# Altium footprint library Hydra_Ref_pcb.PcbLib: 353 footprints (part 5 of 23)
Each footprint in its own frame and in the unit in brackets; x right, y up, seen from the top. Pads: shape width x height; smd on the part's side, far side on the other; paste and mask are expansions set on the pad; w line width, h text height; cw(c..) or ccw(c..) is an arc to the next point about the centre after c.
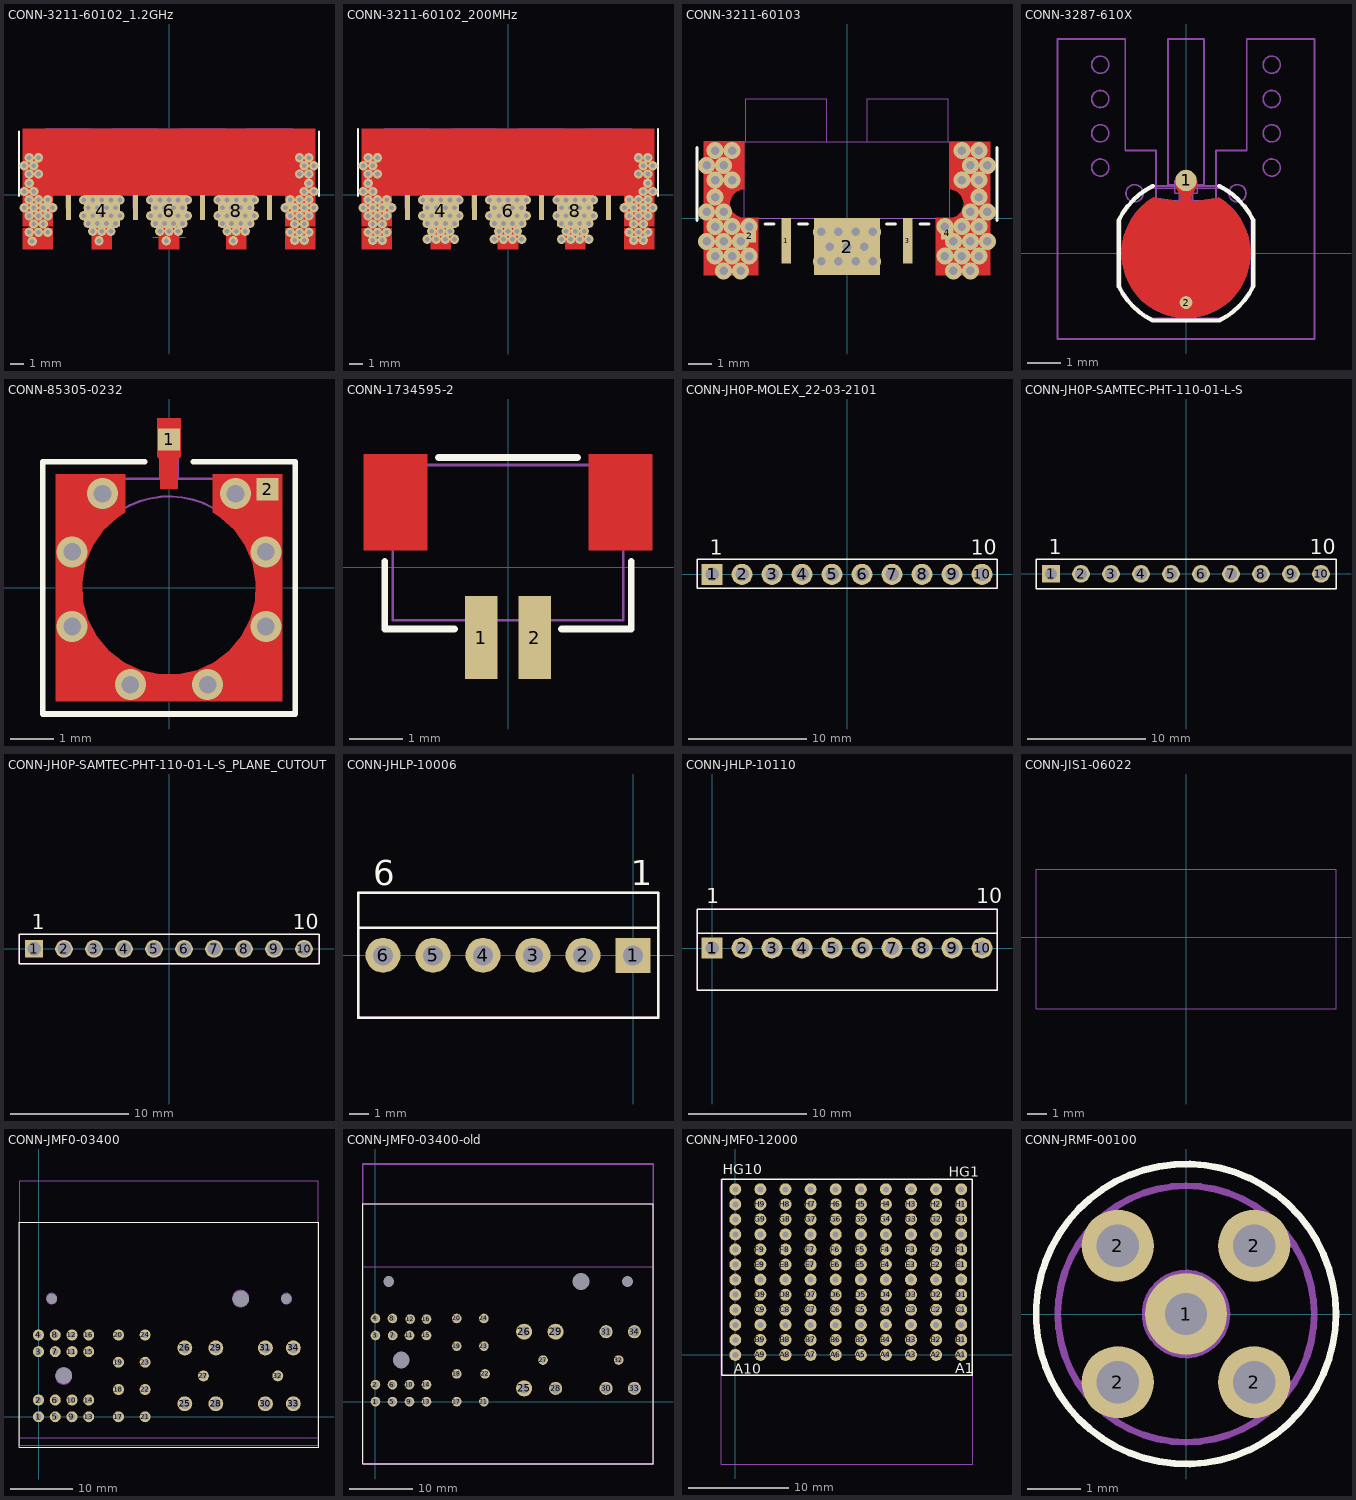
[diagram p4: the footprints below, top view; thin cyan lines are the x and y axes]

## CONN-3211-60102_1.2GHz [mil] "SMPM SB MALE 4 PORT EDGE MOUNT - SV Microwave, Inc"
height 85
pads (9):
  rect 14.96x75 smd: 1(-300,-37.5) 3(-100,-37.5) 5(100,-37.5) 7(300,-37.5)
  rect 20x20 smd paste-1000 mask-1000: 2(-360,-30) 8(359.05,-25.01)
  rect 108x94 smd: 4(-200,-47) 6(0,-47) 8(200,-47)
via -408,-138.07 diameter 28 hole 14
via -361,-14 diameter 28 hole 14
via -389,-14 diameter 28 hole 14
via -375,-38.25 diameter 28 hole 14
via -361,-62.5 diameter 28 hole 14
via -389,-62.5 diameter 28 hole 14
via -403,-38.25 diameter 28 hole 14
via -403,10.25 diameter 28 hole 14
via -417,-14 diameter 28 hole 14
via -417,-62.5 diameter 28 hole 14
via -417,34.5 diameter 28 hole 14
via -403,-86.75 diameter 28 hole 14
via -375,-86.75 diameter 28 hole 14
via -417,62.5 diameter 28 hole 14
via -389,62.5 diameter 28 hole 14
via -403,86.75 diameter 28 hole 14
via -417,110.99 diameter 28 hole 14
via -389,110.99 diameter 28 hole 14
via -431,10.25 diameter 28 hole 14
via -431,86.75 diameter 28 hole 14
via -431,-38.25 diameter 28 hole 14
via 431,-38.25 diameter 28 hole 14
via 431,86.75 diameter 28 hole 14
via 431,10.25 diameter 28 hole 14
via 389,110.99 diameter 28 hole 14
via 417,110.99 diameter 28 hole 14
via 403,86.75 diameter 28 hole 14
via 389,62.5 diameter 28 hole 14
via 417,62.5 diameter 28 hole 14
via 375,-86.75 diameter 28 hole 14
via 403,-86.75 diameter 28 hole 14
via 417,34.5 diameter 28 hole 14
via 417,-62.5 diameter 28 hole 14
via 417,-14 diameter 28 hole 14
via 403,10.25 diameter 28 hole 14
via 403,-38.25 diameter 28 hole 14
via 389,-62.5 diameter 28 hole 14
via 361,-62.5 diameter 28 hole 14
via 375,-38.25 diameter 28 hole 14
via 389,-14 diameter 28 hole 14
via 361,-14 diameter 28 hole 14
via 0,-15 diameter 28 hole 14
via 27,-15 diameter 28 hole 14
via 13.5,-38.38 diameter 28 hole 14
via 40.5,-38.38 diameter 28 hole 14
via 54,-15 diameter 28 hole 14
via -13.5,-38.38 diameter 28 hole 14
via -27,-61.77 diameter 28 hole 14
via -27,-15 diameter 28 hole 14
via -40.5,-38.38 diameter 28 hole 14
via -54,-15 diameter 28 hole 14
via -54,-61.77 diameter 28 hole 14
via 0,-61.77 diameter 28 hole 14
via 27,-61.77 diameter 28 hole 14
via 54,-61.77 diameter 28 hole 14
via -40.5,-85.15 diameter 28 hole 14
via -13.5,-85.15 diameter 28 hole 14
via 40.5,-85.15 diameter 28 hole 14
via 13.5,-85.15 diameter 28 hole 14
via -27,-108.53 diameter 28 hole 14
via 27,-108.53 diameter 28 hole 14
via 0,-108.53 diameter 28 hole 14
via -200,-108.53 diameter 28 hole 14
via -173,-108.53 diameter 28 hole 14
via -227,-108.53 diameter 28 hole 14
via -186.5,-85.15 diameter 28 hole 14
via -159.5,-85.15 diameter 28 hole 14
via -213.5,-85.15 diameter 28 hole 14
via -240.5,-85.15 diameter 28 hole 14
via -146,-61.77 diameter 28 hole 14
via -173,-61.77 diameter 28 hole 14
via -200,-61.77 diameter 28 hole 14
via -254,-61.77 diameter 28 hole 14
via -254,-15 diameter 28 hole 14
via -240.5,-38.38 diameter 28 hole 14
via -227,-15 diameter 28 hole 14
via -227,-61.77 diameter 28 hole 14
via -213.5,-38.38 diameter 28 hole 14
via -146,-15 diameter 28 hole 14
via -159.5,-38.38 diameter 28 hole 14
via -186.5,-38.38 diameter 28 hole 14
via -173,-15 diameter 28 hole 14
via -200,-15 diameter 28 hole 14
via 200,-108.53 diameter 28 hole 14
via 227,-108.53 diameter 28 hole 14
via 173,-108.53 diameter 28 hole 14
via 213.5,-85.15 diameter 28 hole 14
via 240.5,-85.15 diameter 28 hole 14
via 186.5,-85.15 diameter 28 hole 14
via 159.5,-85.15 diameter 28 hole 14
via 254,-61.77 diameter 28 hole 14
via 227,-61.77 diameter 28 hole 14
via 200,-61.77 diameter 28 hole 14
via 146,-61.77 diameter 28 hole 14
via 146,-15 diameter 28 hole 14
via 159.5,-38.38 diameter 28 hole 14
via 173,-15 diameter 28 hole 14
via 173,-61.77 diameter 28 hole 14
via 186.5,-38.38 diameter 28 hole 14
via 254,-15 diameter 28 hole 14
via 240.5,-38.38 diameter 28 hole 14
via 213.5,-38.38 diameter 28 hole 14
via 227,-15 diameter 28 hole 14
via 200,-15 diameter 28 hole 14
via -347,-38.25 diameter 28 hole 14
via 347,-38.25 diameter 28 hole 14
via -389,-110.99 diameter 28 hole 14
via -417,-110.99 diameter 28 hole 14
via -361,-110.99 diameter 28 hole 14
via 375,-135.24 diameter 28 hole 14
via 403,-135.24 diameter 28 hole 14
via 417,-110.99 diameter 28 hole 14
via 361,-110.99 diameter 28 hole 14
via 389,-110.99 diameter 28 hole 14
via -208.5,-137.07 diameter 28 hole 14
via -8.5,-137.07 diameter 28 hole 14
via 191.5,-137.07 diameter 28 hole 14
Top Layer:
  pour cut-out: 436,-161.6 436,-100 346,-100 346,-161.6
  pour cut-out: -436,-161.6 -436,-100 -346,-100 -346,-161.6
  pour cut-out: -230,-100 -230,-161.6 -170,-161.6 -170,-100
  pour cut-out: -30,-100 -30,-161.6 30,-161.6 30,-100
  pour cut-out: 170,-100 170,-161.6 230,-161.6 230,-100
  region: -436,-93.99 -436,197 -369.5,197 -369.5,31 -372.52,30.7 -378.11,28.39 -382.39,24.11 -384.7,18.52 -384.7,12.48 -382.39,6.89 -378.11,2.61 -372.52,0.3 -369.5,0 -346,0 -346,-93.99
  region: 346,-93.99 346,0 369.5,0 372.52,0.3 378.11,2.61 382.39,6.89 384.7,12.48 384.7,18.52 382.39,24.11 378.11,28.39 372.52,30.7 369.5,31 369.5,197 436,197 436,-93.99
  pour cut-out: -369.5,0 -372.58,0 -378.28,2.36 -382.64,6.72 -385,12.42 -385,18.58 -382.64,24.28 -378.28,28.64 -372.58,31 -369.5,31 -369.5,197 369.5,197 369.5,31 372.58,31 378.28,28.64 382.64,24.28 385,18.58 385,12.42 382.64,6.72 378.28,2.36 372.58,0 369.5,0
Mid-Layer 1:
  pour cut-out: -369.5,0 -372.58,0 -378.28,2.36 -382.64,6.72 -385,12.42 -385,18.58 -382.64,24.28 -378.28,28.64 -372.58,31 -369.5,31 -369.5,197 369.5,197 369.5,31 372.58,31 378.28,28.64 382.64,24.28 385,18.58 385,12.42 382.64,6.72 378.28,2.36 372.58,0 369.5,0
MidLayer3:
  pour cut-out: -369.5,0 -372.58,0 -378.28,2.36 -382.64,6.72 -385,12.42 -385,18.58 -382.64,24.28 -378.28,28.64 -372.58,31 -369.5,31 -369.5,197 369.5,197 369.5,31 372.58,31 378.28,28.64 382.64,24.28 385,18.58 385,12.42 382.64,6.72 378.28,2.36 372.58,0 369.5,0
MidLayer2:
  pour cut-out: -369.5,0 -372.58,0 -378.28,2.36 -382.64,6.72 -385,12.42 -385,18.58 -382.64,24.28 -378.28,28.64 -372.58,31 -369.5,31 -369.5,197 369.5,197 369.5,31 372.58,31 378.28,28.64 382.64,24.28 385,18.58 385,12.42 382.64,6.72 378.28,2.36 372.58,0 369.5,0
Bottom Layer:
  pour cut-out: -369.5,0 -372.58,0 -378.28,2.36 -382.64,6.72 -385,12.42 -385,18.58 -382.64,24.28 -378.28,28.64 -372.58,31 -369.5,31 -369.5,197 369.5,197 369.5,31 372.58,31 378.28,28.64 382.64,24.28 385,18.58 385,12.42 382.64,6.72 378.28,2.36 372.58,0 369.5,0
Top Overlay:
  lines w5: -447,-4 -447,190 ; 447,-4 447,190
Top Paste:
  region: 346,-93.99 346,0 369.5,0 372.52,0.3 378.11,2.61 382.39,6.89 384.7,12.48 384.7,18.52 382.39,24.11 378.11,28.39 372.52,30.7 369.5,31 369.5,197 436,197 436,-93.99
  region: -436,-93.99 -436,197 -369.5,197 -369.5,31 -372.52,30.7 -378.11,28.39 -382.39,24.11 -384.7,18.52 -384.7,12.48 -382.39,6.89 -378.11,2.61 -372.52,0.3 -369.5,0 -346,0 -346,-93.99
Top Solder:
  rectangle: 269,-79 331,4
  rectangle: 69,-79 131,4
  rectangle: -131,-79 -69,4
  rectangle: -331,-79 -269,4
  rectangle: 368,-2.5 401,49
  region: -441,-98.98 -441,197 -365,197 -365,4 -342,4 -342,-98.98
  region: 441,197 441,-99.51 342,-99.51 342,4 365,4 365,197
9 Top Assy:
  lines w2: -421,0 420.69,0 ; -367,0 -367,126 -367,197 -233,197 -233,126 ; -351,0 -351,-79 -421,-79 -421,126 421,126 421,-79 351,-79 351,0 ; -306,0 -306,-39 -294,-39 -294,0 ; -249,0 -249,-79 -151,-79 -151,0 ; -167,126 -167,197 -33,197 -33,126 ; -150,0 -40,0 ; -106,0 -106,-39 -94,-39 -94,0 ; -49,-125.77 49,-125.77 ; -49,0 -49,-79 49,-79 49,0 ; 33,126 33,197 167,197 167,126 ; 94,0 94,-39 106,-39 106,0 ; 151,0 151,-79 249,-79 249,0 ; 233,126 233,197 367,197 367,126 367,0 ; 294,0 294,-39 306,-39 306,0
  text ".Designator" at -60,40 h40
3D body: height 85, standoff 0, extent -450,-105 450,135

## CONN-3211-60102_200MHz [mil] "SMPM SB MALE 4 PORT EDGE MOUNT - SV Microwave, Inc"
height 85
pads (9):
  rect 14.96x75 smd: 1(-300,-37.5) 3(-100,-37.5) 5(100,-37.5) 7(300,-37.5)
  rect 20x20 smd paste-1000 mask-1000: 2(-360,-30) 8(359.05,-25.01)
  rect 108x94 smd: 4(-200,-47) 6(0,-47) 8(200,-47)
via 389,-110.99 diameter 28 hole 14
via 361,-110.99 diameter 28 hole 14
via 417,-110.99 diameter 28 hole 14
via 403,-135.24 diameter 28 hole 14
via 375,-135.24 diameter 28 hole 14
via -403,-135.24 diameter 28 hole 14
via -375,-135.24 diameter 28 hole 14
via -361,-110.99 diameter 28 hole 14
via -417,-110.99 diameter 28 hole 14
via -389,-110.99 diameter 28 hole 14
via 347,-38.25 diameter 28 hole 14
via -347,-38.25 diameter 28 hole 14
via 200,-15 diameter 28 hole 14
via 227,-15 diameter 28 hole 14
via 213.5,-38.38 diameter 28 hole 14
via 240.5,-38.38 diameter 28 hole 14
via 254,-15 diameter 28 hole 14
via 186.5,-38.38 diameter 28 hole 14
via 173,-61.77 diameter 28 hole 14
via 173,-15 diameter 28 hole 14
via 159.5,-38.38 diameter 28 hole 14
via 146,-15 diameter 28 hole 14
via 146,-61.77 diameter 28 hole 14
via 200,-61.77 diameter 28 hole 14
via 227,-61.77 diameter 28 hole 14
via 254,-61.77 diameter 28 hole 14
via 159.5,-85.15 diameter 28 hole 14
via 186.5,-85.15 diameter 28 hole 14
via 240.5,-85.15 diameter 28 hole 14
via 213.5,-85.15 diameter 28 hole 14
via 173,-108.53 diameter 28 hole 14
via 227,-108.53 diameter 28 hole 14
via 200,-108.53 diameter 28 hole 14
via 213.5,-131.91 diameter 28 hole 14
via 240.5,-131.91 diameter 28 hole 14
via 186.5,-131.91 diameter 28 hole 14
via 159.5,-131.91 diameter 28 hole 14
via -200,-15 diameter 28 hole 14
via -173,-15 diameter 28 hole 14
via -186.5,-38.38 diameter 28 hole 14
via -159.5,-38.38 diameter 28 hole 14
via -146,-15 diameter 28 hole 14
via -213.5,-38.38 diameter 28 hole 14
via -227,-61.77 diameter 28 hole 14
via -227,-15 diameter 28 hole 14
via -240.5,-38.38 diameter 28 hole 14
via -254,-15 diameter 28 hole 14
via -254,-61.77 diameter 28 hole 14
via -200,-61.77 diameter 28 hole 14
via -173,-61.77 diameter 28 hole 14
via -146,-61.77 diameter 28 hole 14
via -240.5,-85.15 diameter 28 hole 14
via -213.5,-85.15 diameter 28 hole 14
via -159.5,-85.15 diameter 28 hole 14
via -186.5,-85.15 diameter 28 hole 14
via -227,-108.53 diameter 28 hole 14
via -173,-108.53 diameter 28 hole 14
via -200,-108.53 diameter 28 hole 14
via -186.5,-131.91 diameter 28 hole 14
via -159.5,-131.91 diameter 28 hole 14
via -213.5,-131.91 diameter 28 hole 14
via -240.5,-131.91 diameter 28 hole 14
via -40.5,-131.91 diameter 28 hole 14
via -13.5,-131.91 diameter 28 hole 14
via 40.5,-131.91 diameter 28 hole 14
via 13.5,-131.91 diameter 28 hole 14
via 0,-108.53 diameter 28 hole 14
via 27,-108.53 diameter 28 hole 14
via -27,-108.53 diameter 28 hole 14
via 13.5,-85.15 diameter 28 hole 14
via 40.5,-85.15 diameter 28 hole 14
via -13.5,-85.15 diameter 28 hole 14
via -40.5,-85.15 diameter 28 hole 14
via 54,-61.77 diameter 28 hole 14
via 27,-61.77 diameter 28 hole 14
via 0,-61.77 diameter 28 hole 14
via -54,-61.77 diameter 28 hole 14
via -54,-15 diameter 28 hole 14
via -40.5,-38.38 diameter 28 hole 14
via -27,-15 diameter 28 hole 14
via -27,-61.77 diameter 28 hole 14
via -13.5,-38.38 diameter 28 hole 14
via 54,-15 diameter 28 hole 14
via 40.5,-38.38 diameter 28 hole 14
via 13.5,-38.38 diameter 28 hole 14
via 27,-15 diameter 28 hole 14
via 0,-15 diameter 28 hole 14
via 361,-14 diameter 28 hole 14
via 389,-14 diameter 28 hole 14
via 375,-38.25 diameter 28 hole 14
via 361,-62.5 diameter 28 hole 14
via 389,-62.5 diameter 28 hole 14
via 403,-38.25 diameter 28 hole 14
via 403,10.25 diameter 28 hole 14
via 417,-14 diameter 28 hole 14
via 417,-62.5 diameter 28 hole 14
via 417,34.5 diameter 28 hole 14
via 403,-86.75 diameter 28 hole 14
via 375,-86.75 diameter 28 hole 14
via 417,62.5 diameter 28 hole 14
via 389,62.5 diameter 28 hole 14
via 403,86.75 diameter 28 hole 14
via 417,110.99 diameter 28 hole 14
via 389,110.99 diameter 28 hole 14
via 431,10.25 diameter 28 hole 14
via 431,86.75 diameter 28 hole 14
via 431,-38.25 diameter 28 hole 14
via -431,-38.25 diameter 28 hole 14
via -431,86.75 diameter 28 hole 14
via -431,10.25 diameter 28 hole 14
via -389,110.99 diameter 28 hole 14
via -417,110.99 diameter 28 hole 14
via -403,86.75 diameter 28 hole 14
via -389,62.5 diameter 28 hole 14
via -417,62.5 diameter 28 hole 14
via -375,-86.75 diameter 28 hole 14
via -403,-86.75 diameter 28 hole 14
via -417,34.5 diameter 28 hole 14
via -417,-62.5 diameter 28 hole 14
via -417,-14 diameter 28 hole 14
via -403,10.25 diameter 28 hole 14
via -403,-38.25 diameter 28 hole 14
via -389,-62.5 diameter 28 hole 14
via -361,-62.5 diameter 28 hole 14
via -375,-38.25 diameter 28 hole 14
via -389,-14 diameter 28 hole 14
via -361,-14 diameter 28 hole 14
Top Layer:
  region: -436,-93.99 -436,197 -369.5,197 -369.5,31 -372.52,30.7 -378.11,28.39 -382.39,24.11 -384.7,18.52 -384.7,12.48 -382.39,6.89 -378.11,2.61 -372.52,0.3 -369.5,0 -346,0 -346,-93.99
  region: 346,-93.99 346,0 369.5,0 372.52,0.3 378.11,2.61 382.39,6.89 384.7,12.48 384.7,18.52 382.39,24.11 378.11,28.39 372.52,30.7 369.5,31 369.5,197 436,197 436,-93.99
  pour cut-out: 170,-100 170,-161.6 230,-161.6 230,-100
  pour cut-out: -30,-100 -30,-161.6 30,-161.6 30,-100
  pour cut-out: -230,-100 -230,-161.6 -170,-161.6 -170,-100
  pour cut-out: -436,-161.6 -436,-100 -346,-100 -346,-161.6
  pour cut-out: 436,-161.6 436,-100 346,-100 346,-161.6
  pour cut-out: -369.5,0 -372.58,0 -378.28,2.36 -382.64,6.72 -385,12.42 -385,18.58 -382.64,24.28 -378.28,28.64 -372.58,31 -369.5,31 -369.5,197 369.5,197 369.5,31 372.58,31 378.28,28.64 382.64,24.28 385,18.58 385,12.42 382.64,6.72 378.28,2.36 372.58,0 369.5,0
Mid-Layer 1:
  pour cut-out: -369.5,0 -372.58,0 -378.28,2.36 -382.64,6.72 -385,12.42 -385,18.58 -382.64,24.28 -378.28,28.64 -372.58,31 -369.5,31 -369.5,197 369.5,197 369.5,31 372.58,31 378.28,28.64 382.64,24.28 385,18.58 385,12.42 382.64,6.72 378.28,2.36 372.58,0 369.5,0
MidLayer3:
  pour cut-out: -369.5,0 -372.58,0 -378.28,2.36 -382.64,6.72 -385,12.42 -385,18.58 -382.64,24.28 -378.28,28.64 -372.58,31 -369.5,31 -369.5,197 369.5,197 369.5,31 372.58,31 378.28,28.64 382.64,24.28 385,18.58 385,12.42 382.64,6.72 378.28,2.36 372.58,0 369.5,0
MidLayer2:
  pour cut-out: -369.5,0 -372.58,0 -378.28,2.36 -382.64,6.72 -385,12.42 -385,18.58 -382.64,24.28 -378.28,28.64 -372.58,31 -369.5,31 -369.5,197 369.5,197 369.5,31 372.58,31 378.28,28.64 382.64,24.28 385,18.58 385,12.42 382.64,6.72 378.28,2.36 372.58,0 369.5,0
Bottom Layer:
  pour cut-out: -369.5,0 -372.58,0 -378.28,2.36 -382.64,6.72 -385,12.42 -385,18.58 -382.64,24.28 -378.28,28.64 -372.58,31 -369.5,31 -369.5,197 369.5,197 369.5,31 372.58,31 378.28,28.64 382.64,24.28 385,18.58 385,12.42 382.64,6.72 378.28,2.36 372.58,0 369.5,0
Top Overlay:
  lines w5: -447,-4 -447,197 ; 447,-4 447,197
Top Paste:
  region: -436,-93.99 -436,197 -369.5,197 -369.5,31 -372.52,30.7 -378.11,28.39 -382.39,24.11 -384.7,18.52 -384.7,12.48 -382.39,6.89 -378.11,2.61 -372.52,0.3 -369.5,0 -346,0 -346,-93.99
  region: 346,-93.99 346,0 369.5,0 372.52,0.3 378.11,2.61 382.39,6.89 384.7,12.48 384.7,18.52 382.39,24.11 378.11,28.39 372.52,30.7 369.5,31 369.5,197 436,197 436,-93.99
Top Solder:
  rectangle: 368,-2.5 401,49
  rectangle: -331,-79 -269,4
  rectangle: -131,-79 -69,4
  rectangle: 69,-79 131,4
  rectangle: 269,-79 331,4
  region: 441,197 441,-99.51 342,-99.51 342,4 365,4 365,197
  region: -441,-98.98 -441,197 -365,197 -365,4 -342,4 -342,-98.98
9 Top Assy:
  lines w2: -421,0 420.69,0 ; -367,0 -367,126 -367,197 -233,197 -233,126 ; -351,0 -351,-79 -421,-79 -421,126 421,126 421,-79 351,-79 351,0 ; -306,0 -306,-39 -294,-39 -294,0 ; -249,0 -249,-79 -151,-79 -151,0 ; -167,126 -167,197 -33,197 -33,126 ; -150,0 -40,0 ; -106,0 -106,-39 -94,-39 -94,0 ; -49,-125.77 49,-125.77 ; -49,0 -49,-79 49,-79 49,0 ; 33,126 33,197 167,197 167,126 ; 94,0 94,-39 106,-39 106,0 ; 151,0 151,-79 249,-79 249,0 ; 233,126 233,197 367,197 367,126 367,0 ; 294,0 294,-39 306,-39 306,0
  text ".Designator" at -60,40 h40
3D body: height 85, standoff 0, extent -450,-105 450,135

## CONN-3211-60103 [mil] "SMPM SB MALE 2 PORT EDGE MOUNT - SV Microwave, Inc"
height 77
pads (5):
  rect 14.96x75 smd: 1(-100,-37.5) 3(100,-37.5)
  rect 20x20 smd paste-1000 mask-1000: 2(-160,-30) 4(165,-25)
  rect 108x94 smd: 2(0,-47)
via 231,-38.25 diameter 28 hole 14
via 231,86.75 diameter 28 hole 14
via 231,10.25 diameter 28 hole 14
via 189,110.99 diameter 28 hole 14
via 217,110.99 diameter 28 hole 14
via 203,86.75 diameter 28 hole 14
via 189,62.5 diameter 28 hole 14
via 217,62.5 diameter 28 hole 14
via 175,-86.75 diameter 28 hole 14
via 203,-86.75 diameter 28 hole 14
via 217,34.5 diameter 28 hole 14
via 217,-62.5 diameter 28 hole 14
via 217,-14 diameter 28 hole 14
via 203,10.25 diameter 28 hole 14
via 203,-38.25 diameter 28 hole 14
via 189,-62.5 diameter 28 hole 14
via 161,-62.5 diameter 28 hole 14
via 175,-38.25 diameter 28 hole 14
via 189,-14 diameter 28 hole 14
via 161,-14 diameter 28 hole 14
via -161,-14 diameter 28 hole 14
via -189,-14 diameter 28 hole 14
via -175,-38.25 diameter 28 hole 14
via -161,-62.5 diameter 28 hole 14
via -189,-62.5 diameter 28 hole 14
via -203,-38.25 diameter 28 hole 14
via -203,10.25 diameter 28 hole 14
via -217,-14 diameter 28 hole 14
via -217,-62.5 diameter 28 hole 14
via -217,34.5 diameter 28 hole 14
via -203,-86.75 diameter 28 hole 14
via -175,-86.75 diameter 28 hole 14
via -217,62.5 diameter 28 hole 14
via -189,62.5 diameter 28 hole 14
via -203,86.75 diameter 28 hole 14
via -217,110.99 diameter 28 hole 14
via -189,110.99 diameter 28 hole 14
via -231,10.25 diameter 28 hole 14
via -231,86.75 diameter 28 hole 14
via -231,-38.25 diameter 28 hole 14
via 14,-71.25 diameter 28 hole 14
via -14,-71.25 diameter 28 hole 14
via -28,-47 diameter 28 hole 14
via -14,-22.75 diameter 28 hole 14
via 0,-47 diameter 28 hole 14
via 28,-47 diameter 28 hole 14
via 14,-22.75 diameter 28 hole 14
via -42,-71.25 diameter 28 hole 14
via 42,-71.25 diameter 28 hole 14
via -42,-22.75 diameter 28 hole 14
via 42,-22.75 diameter 28 hole 14
Top Layer:
  region: -169.5,126.46 -169.5,47.46 -174.08,47.01 -182.56,43.5 -189.04,37.02 -192.55,28.55 -193,23.96 -192.55,19.38 -189.04,10.9 -182.56,4.42 -174.08,0.91 -169.5,0.46 -146,0.46 -146,-94 -236,-94 -236,126.46
  region: 168.5,126 168.5,47.27 173.08,46.82 181.55,43.31 188.04,36.83 191.55,28.36 192,23.77 191.55,19.19 188.04,10.71 181.56,4.23 173.08,0.72 168.5,0.27 146,0.27 146,-94 236,-94 236,126
Top Overlay:
  lines w5: -247,-4 -247,116 ; -135,-10 -120,-10 ; -80,-10 -65,-10 ; 65,-10 80,-10 ; 120,-10 135,-10 ; 247,-4 247,116
Top Paste:
  region: -169.5,126.46 -169.5,47.46 -174.08,47.01 -182.56,43.5 -189.04,37.02 -192.55,28.55 -193,23.96 -192.55,19.38 -189.04,10.9 -182.56,4.42 -174.08,0.91 -169.5,0.46 -146,0.46 -146,-94 -236,-94 -236,126.46
  region: 169,126 169,47.27 173.58,46.82 182.05,43.31 188.54,36.83 192.05,28.36 192.5,23.77 192.05,19.19 188.54,10.71 182.05,4.23 173.58,0.72 169,0.27 146,0.27 146,-94 236,-94 236,126
Top Solder:
  rectangle: -196.5,-3 -164.5,48
  rectangle: 164,-2.5 197,49
  region: 164,131 164,47.27 169,47.27 173.58,46.82 182.05,43.31 188.54,36.83 192.05,28.36 192.5,23.77 192.05,19.19 188.54,10.71 182.05,4.23 173.58,0.72 169,0.27 169,5.5 142,5.5 142,-99 241,-99 241,131
  region: -164.5,131.5 -164.5,47.46 -169.5,47.46 -174.08,47.01 -182.56,43.5 -189.04,37.02 -192.55,28.55 -193,23.96 -192.55,19.38 -189.04,10.9 -182.56,4.42 -174.08,0.91 -169.5,0.46 -169.5,4.5 -142,4.5 -142,-99 -240.5,-99 -240.5,131.5
9 Top Assy:
  lines w2: -221,0 221,0 ; -169,0 -169,126 ; -167,126 -167,197 -33,197 -33,126 ; -151,0 -151,-79 -221,-79 -221,126 221,126 221,-79 151,-79 151,0 ; -150,0 -40,0 ; -106,0 -106,-39 -94,-39 -94,0 ; -49,0 -49,-79 49,-79 49,0 ; 33,126 33,197 167,197 167,126 ; 94,0 94,-39 106,-39 106,0 ; 169,0 169,126
  text ".Designator" at -60,40 h40
3D body: height 77, standoff 0, extent -250,-105.21 250,134.79

## CONN-3287-610X [mil] "SMMP;M;PCB;.152X.152X.150;SURF MT"
height 155
pads (2):
  round 25 smd paste+0 mask+2.5: 1(0,85)
  round 15 smd paste-1000 mask-1000: 2(0,-57.5)
Top Layer:
  pour cut-out: -14.06,33.14 -18.62,31.21 -26.36,25.02 -32.13,16.98 -35.52,7.67 -36.28,-2.21 -34.33,-11.92 -29.84,-20.75 -23.13,-28.03 -14.7,-33.24 -5.18,-35.97 4.72,-36.03 14.28,-33.42 22.77,-28.32 29.57,-21.12 34.18,-12.36 36.24,-2.67 35.62,7.22 32.35,16.57 26.67,24.68 19.02,30.97 14.48,32.96 14.48,61 -14.06,61
  region: -38,64.66 -45.06,60.51 -57.06,49.36 -66.37,35.88 -72.55,20.71 -75.31,4.57 -74.52,-11.79 -70.22,-27.6 -62.61,-42.1 -52.05,-54.62 -39.03,-64.56 -24.18,-71.47 -8.19,-75 8.19,-75 24.18,-71.47 39.03,-64.56 52.05,-54.62 62.61,-42.1 70.22,-27.6 74.52,-11.79 75.31,4.57 72.55,20.71 66.37,35.88 57.06,49.36 45.06,60.51 38,64.66 13.5,61 13.54,61 13.54,30.09 18.44,27.37 26.51,19.66 31.54,9.7 32.97,-1.37 30.63,-12.28 24.78,-21.79 16.1,-28.8 5.58,-32.52 -5.58,-32.52 -16.1,-28.8 -24.78,-21.79 -30.63,-12.28 -32.97,-1.37 -31.54,9.7 -26.51,19.66 -18.44,27.37 -13.54,30.09 -13.5,30.09 -13.5,61
  region: -6,66 -12.5,79 -12.5,86 0,77.5 12.5,86 12.5,79 6,66 6,45 -6,45
Top Overlay:
  lines w5: -78.5,-38.72 -78.5,38.59 cw(c0,0) -38.59,78.49 ; -78.49,-38.59 ccw(c0,0) -38.59,-78.49 38.72,-78.5 ; 38.59,-78.49 ccw(c0,0) 78.49,-38.59 78.5,38.72 ; 38.59,78.49 cw(c0,0) 78.49,38.59
Top Solder:
  circle w30: c0,0 r15
  rectangle: -8.5,21 8.5,35
  region: -18.5,57 -18.5,61.5 -23.5,62.5 -38.04,64.71 -41.87,62.66 -47.58,57.98 -53.29,53.29 -57.98,47.58 -62.66,41.87 -66.14,35.35 -69.63,28.84 -73.91,14.7 -74.64,7.35 -75.36,0 -74.64,-7.35 -73.91,-14.7 -72,-21 -69.63,-28.84 -66.14,-35.35 -62.66,-41.87 -57.98,-47.58 -53.29,-53.29 -47,-58.5 -41.87,-62.66 -35.35,-66.14 -28.84,-69.63 -14.7,-73.92 -7.35,-74.64 0,-75.36 7.35,-74.64 14.7,-73.92 28.84,-69.63 35.35,-66.14 41.87,-62.66 47.58,-57.98 53.29,-53.29 57.98,-47.58 62.66,-41.87 65,-37.5 69.63,-28.84 73.91,-14.7 74.64,-7.35 75.36,0 74.64,7.35 73.91,14.7 69.63,28.84 66.14,35.35 62.66,41.87 57.98,47.58 53.29,53.29 47.58,57.98 41.87,62.66 38.04,64.71 18.5,62 18.5,57 27,51.5 27,38 37.5,28 47,8 46.5,-6.5 41.5,-21.77 32.5,-34.5 19,-43.5 2.5,-47.5 -14,-46 -28.5,-38.5 -40.5,-25 -47.5,-8 -47.58,10.5 -41,25.5 -31.5,37.5 -27.5,39.5 -27.5,51
9 Top Assy:
  lines w2: -78.5,-38.72 -78.5,38.59 cw(c0,0) -38.59,78.49 ; -78.49,-38.59 ccw(c0,0) -38.59,-78.49 38.72,-78.5 ; -38.72,78.5 38.59,78.5 cw(c0,0) 78.49,38.59 ; 38.59,-78.49 ccw(c0,0) 78.49,-38.59 78.5,38.72 ; -6,78.5 6,78.5 6,85 -6,85 -6,78.5
  text ".Designator" at -40,-8.12 h20
13 Top 3D Bodies:
  circle w2: c0,0 r62.5
  lines w2: -6,76 -6,85 6,85 6,76 ; -75.99,-43.37 ccw(c0,0) -43.32,-76.02 43.34,-76 ccw(c0,0) 76.02,-43.32 76,43.34 ccw(c0,0) 43.32,76.02 -43.34,76 ccw(c0,0) -76.02,43.32 -76,-43.34
Mechanical 30:
  circle w2: c-31.82,-31.82 r10
  circle w2: c31.82,31.82 r10
  circle w2: c-60,70 r10
  circle w2: c-31.82,31.82 r10
  circle w2: c31.82,-31.82 r10
  circle w2: c60,70 r10
  circle w2: c-45,0 r10
  circle w2: c45,0 r10
  circle w2: c0,-45 r10
  circle w2: c-100,220 r10
  circle w2: c-100,180 r10
  circle w2: c-100,140 r10
  circle w2: c100,100 r10
  circle w2: c100,140 r10
  circle w2: c100,180 r10
  circle w2: c100,220 r10
  circle w2: c-100,100 r10
  lines w0: -13.54,30.09 ccw(c0,0) 13.54,30.09 13.54,61 ; -13.5,30.09 -13.5,61 ; -13.5,61 -38,64.66 ccw(c0,0) 38,64.66 13.5,61 13.5,0 cw(c0,0) -13.5,0 -13.5,61 ; -13,80 -13,85 0,72 13,85 13,80 6,66 6,45 -6,45 -6,66 -13,80
  lines w2: -38,64.66 -13.5,61 ; 0,-17.55 0,0 ; -13.5,61 -13.5,0 ccw(c0,0) 13.5,0 13.5,61 35,61 35,120 71,120 71,250 150,250 150,-100 -150,-100 -150,250 -71,250 -71,120 -35,120 -35,61 -13.5,61 ; -21,80 -21,250 21,250 21,80 13,80 13,70 8,70 8,45 -8,45 -8,70 -13,70 -13,80 -21,80
3D body: height 150.62, standoff 0.57, extent -76.04,-75.99 76.01,85.01

## CONN-85305-0232 [mil] "SMP PLUG SMT MOLEX"
height 165
pads (2):
  rect 20x20 smd paste-20 mask-20: 1(0,134)
  rect 20x20 smd paste-1000 mask-1000: 2(89,89)
via -60,85 diameter 28 hole 16
via 60,85 diameter 28 hole 16
via 35,-87.5 diameter 28 hole 16
via -35,-87.5 diameter 28 hole 16
via -87.5,32.5 diameter 28 hole 16
via 87.5,32.5 diameter 28 hole 16
via -87.5,-35 diameter 28 hole 16
via 87.5,-35 diameter 28 hole 16
Top Layer:
  region: 10.75,153 10.75,118.28 7.87,115.41 7.87,89.49 -7.87,89.49 -7.87,115.41 -10.75,118.28 -10.75,153
  region: 102.36,102.36 102.36,-102.36 -102.36,-102.36 -102.36,102.36 -39.37,102.36 -39.37,68.19 -46.56,63.5 -59.2,51.92 -69.03,37.87 -75.59,22.03 -78.57,5.15 -77.82,-11.98 -73.39,-28.54 -65.47,-43.75 -54.45,-56.88 -40.85,-67.32 -25.31,-74.56 -8.57,-78.27 8.57,-78.27 25.31,-74.56 40.85,-67.32 54.45,-56.88 65.47,-43.75 73.39,-28.54 77.82,-11.98 78.57,5.15 75.59,22.03 69.03,37.87 59.2,51.92 46.56,63.5 39.37,68.19 39.37,102.36
Top Overlay:
  lines w5: -22,114 -114,114 -114,-114 114,-114 114,114 22,114
Top Paste:
  region: 10.75,153 10.75,118.28 7.87,115.41 7.87,89.49 -7.87,89.49 -7.87,115.41 -10.75,118.28 -10.75,153
  region: 102.36,102.36 102.36,-102.36 -102.36,-102.36 -102.36,102.36 -39.37,102.36 -39.37,68.19 -46.56,63.5 -59.2,51.92 -69.03,37.87 -75.59,22.03 -78.57,5.15 -77.82,-11.98 -73.39,-28.54 -65.47,-43.75 -54.45,-56.88 -40.85,-67.32 -25.31,-74.56 -8.57,-78.27 8.57,-78.27 25.31,-74.56 40.85,-67.32 54.45,-56.88 65.47,-43.75 73.39,-28.54 77.82,-11.98 78.57,5.15 75.59,22.03 69.03,37.87 59.2,51.92 46.56,63.5 39.37,68.19 39.37,102.36
Top Solder:
  region: 106.5,106.5 106.5,-106.5 -106.5,-106.5 -106.5,106.5 -34.37,106.5 -34.37,66.1 -41.37,61.91 -53.76,51.33 -63.53,38.3 -70.2,23.43 -73.44,7.46 -73.1,-8.82 -69.19,-24.64 -61.9,-39.21 -51.59,-51.83 -38.76,-61.87 -24.04,-68.85 -8.15,-72.43 8.15,-72.43 24.04,-68.85 38.76,-61.87 51.59,-51.83 61.9,-39.21 69.19,-24.64 73.1,-8.82 73.44,7.46 70.2,23.43 63.53,38.3 53.76,51.33 41.37,61.91 34.37,66.1 34.37,106.5
  region: 12,85.5 12,113 15,116 15,157 -15,157 -15,116 -12,113 -12,85.5
9 Top Assy:
  circle w2: c0,0 r82.5
  lines w2: -7.87,98.82 -7.87,137.8 7.87,137.8 7.87,98.43 ; -98.43,-82.68 -98.43,82.68 -82.68,98.43 82.68,98.43 98.43,82.68 98.43,-82.68 82.68,-98.43 -82.68,-98.43 -98.43,-82.68
  text ".Designator" at -70,-20 h40
3D body: height 165, standoff 0, extent -120,-120 120,120

## CONN-1734595-2 [mm]
height 5.1
pads (2):
  rect 0.6x1.55 smd: 1(-0.5,-1.312) 2(0.5,-1.312)
Top Layer:
  rectangle: 1.5,0.312 2.7,2.113
  rectangle: -2.7,0.312 -1.5,2.113
Top Overlay:
  lines w0.127: -2.3,0.112 -2.3,-1.15 -1,-1.15 ; -1.3,2.05 1.3,2.05 ; 1,-1.15 2.3,-1.15 2.3,0.112
Top Paste:
  rectangle: 1.5,0.312 2.7,2.113
  rectangle: -2.7,0.312 -1.5,2.113
Top Solder:
  rectangle: 1.4,0.212 2.8,2.213
  rectangle: -2.8,0.212 -1.4,2.213
9 Top Assy:
  lines w0.051: -0.6,-1.012 -0.6,-1.712 -0.4,-1.712 -0.4,-1.012 ; 0.4,-1.012 0.4,-1.712 0.6,-1.712 0.6,-1.012 ; -2.15,-0.987 2.15,-0.987 2.15,1.913 -2.15,1.913 -2.15,-0.987
  text ".Designator" at -1.7,-0.012 h1.02
3D body: height 5.1, standoff 0, extent -2.4,-2.312 2.4,3.688

## CONN-JH0P-MOLEX_22-03-2101 [mil] "HEADER;.1CTR;10PIN;STRAIGHT;TIN"
height 425.6
pads (10):
  rect 70x70 / inner round 59 / far side rect 70x70 hole 45: 1(-450,0)
  round 70 / inner round 59 / far side round 70 hole 45: 2(-350,0) 3(-250,0) 4(-150,0) 5(-50,0) 6(50,0) 7(150,0) 8(250,0) 9(350,0) 10(450,0)
Top Overlay:
  lines w5: -500,-46 500,-46 500,50 -500,50 -500,-46
  text "10" at 412.51,65 h50
  text "1" at -458.33,65 h50
9 Top Assy:
  lines w2: -500,-46 -500,50 500,50 500,-46 -500,-46
  text ".Designator" at -104.97,-27.99 h60
3D body: height 425.6, standoff -134.4, extent -495,-46 495,46

## CONN-JH0P-SAMTEC-PHT-110-01-L-S [mil] "HEADER;.1CTR;10PIN;STRAIGHT;PRESS FIT;GOLD"
height 330
pads (10):
  rect 59x59 hole 39: 1(-450,0)
  round 59 hole 39: 2(-350,0) 3(-250,0) 4(-150,0) 5(-50,0) 6(50,0) 7(150,0) 8(250,0) 9(350,0) 10(450,0)
Top Overlay:
  lines w5: -500,-49 -500,49 500,49 500,-49 -500,-49
  text "1" at -458.33,65 h50
  text "10" at 412.51,65 h50
9 Top Assy:
  lines w2: -500,-49 500,-49 500,49 -500,49 -500,-49
  text ".Designator" at -104.97,-27.99 h60
3D body: height 100, standoff 0, extent -500,-49 500,49
3D body: height 330, standoff 100, extent -462.5,-12.5 -437.5,12.5
3D body: height 330, standoff 100, extent -362.5,-12.5 -337.5,12.5
3D body: height 330, standoff 100, extent -262.5,-12.5 -237.5,12.5
3D body: height 330, standoff 100, extent -162.5,-12.5 -137.5,12.5
3D body: height 330, standoff 100, extent -62.5,-12.5 -37.5,12.5
3D body: height 330, standoff 100, extent 37.5,-12.5 62.5,12.5
3D body: height 330, standoff 100, extent 137.5,-12.5 162.5,12.5
3D body: height 330, standoff 100, extent 237.5,-12.5 262.5,12.5
3D body: height 330, standoff 100, extent 337.5,-12.5 362.5,12.5
3D body: height 330, standoff 100, extent 437.5,-12.5 462.5,12.5
3D body: height 0, standoff -122, extent -473.5,-6 -426.49,6.01
3D body: height 0, standoff -122, extent -373.5,-6 -326.49,6
3D body: height 0, standoff -122, extent -273.5,-6 -226.49,6
3D body: height 0, standoff -122, extent -173.5,-6 -126.49,6
3D body: height 0, standoff -122, extent -73.5,-6 -26.49,6
3D body: height 0, standoff -122, extent 26.5,-6 73.51,6
3D body: height 0, standoff -122, extent 126.5,-6 173.51,6
3D body: height 0, standoff -122, extent 226.5,-6 273.51,6
3D body: height 0, standoff -122, extent 326.5,-6 373.51,6
3D body: height 0, standoff -122, extent 426.5,-6 473.51,6

## CONN-JH0P-SAMTEC-PHT-110-01-L-S_PLANE_CUTOUT [mil] "HEADER;.1CTR;10PIN;STRAIGHT;PRESS FIT;GOLD"
height 330
pads (10):
  rect 59x59 hole 45: 1(-450,0)
  round 59 hole 45: 2(-350,0) 3(-250,0) 4(-150,0) 5(-50,0) 6(50,0) 7(150,0) 8(250,0) 9(350,0) 10(450,0)
Top Overlay:
  lines w5: -500,-49 -500,49 500,49 500,-49 -500,-49
  text "1" at -458.33,65 h50
  text "10" at 412.51,65 h50
Internal Plane 1:
  lines w10: -483.11,-17.61 cw(c-450,0) -483.11,17.61 ; -467.61,-33.11 ccw(c-450,0) -432.39,-33.11 ; -467.61,33.11 cw(c-450,0) -432.39,33.11 ; -416.89,-17.61 ccw(c-450,0) -416.89,17.61 ; -383.11,-17.61 cw(c-350,0) -383.11,17.61 ; -367.61,-33.11 ccw(c-350,0) -332.39,-33.11 ; -367.61,33.11 cw(c-350,0) -332.39,33.11 ; -316.89,-17.61 ccw(c-350,0) -316.89,17.61 ; -283.11,-17.61 cw(c-250,0) -283.11,17.61 ; -267.61,-33.11 ccw(c-250,0) -232.39,-33.11 ; -267.61,33.11 cw(c-250,0) -232.39,33.11 ; -216.89,-17.61 ccw(c-250,0) -216.89,17.61 ; -183.11,-17.61 cw(c-150,0) -183.11,17.61 ; -167.61,-33.11 ccw(c-150,0) -132.39,-33.11 ; -167.61,33.11 cw(c-150,0) -132.39,33.11 ; -116.89,-17.61 ccw(c-150,0) -116.89,17.61 ; -83.11,-17.61 cw(c-50,0) -83.11,17.61 ; -67.61,-33.11 ccw(c-50,0) -32.39,-33.11 ; -67.61,33.11 cw(c-50,0) -32.39,33.11 ; -16.89,-17.61 ccw(c-50,0) -16.89,17.61 ; 16.89,-17.61 cw(c50,0) 16.89,17.61 ; 32.39,-33.11 ccw(c50,0) 67.61,-33.11 ; 32.39,33.11 cw(c50,0) 67.61,33.11 ; 83.11,-17.61 ccw(c50,0) 83.11,17.61 ; 116.89,-17.61 cw(c150,0) 116.89,17.61 ; 132.39,-33.11 ccw(c150,0) 167.61,-33.11 ; 132.39,33.11 cw(c150,0) 167.61,33.11 ; 183.11,-17.61 ccw(c150,0) 183.11,17.61 ; 216.89,-17.61 cw(c250,0) 216.89,17.61 ; 232.39,-33.11 ccw(c250,0) 267.61,-33.11 ; 232.39,33.11 cw(c250,0) 267.61,33.11 ; 283.11,-17.61 ccw(c250,0) 283.11,17.61 ; 316.89,-17.61 cw(c350,0) 316.89,17.61 ; 332.39,-33.11 ccw(c350,0) 367.61,-33.11 ; 332.39,33.11 cw(c350,0) 367.61,33.11 ; 383.11,-17.61 ccw(c350,0) 383.11,17.61 ; 416.89,-17.61 cw(c450,0) 416.89,17.61 ; 432.39,-33.11 ccw(c450,0) 467.61,-33.11 ; 432.39,33.11 cw(c450,0) 467.61,33.11 ; 483.11,-17.61 ccw(c450,0) 483.11,17.61
Internal Plane 4:
  lines w10: -483.11,-17.61 cw(c-450,0) -483.11,17.61 ; -467.61,-33.11 ccw(c-450,0) -432.39,-33.11 ; -467.61,33.11 cw(c-450,0) -432.39,33.11 ; -416.89,-17.61 ccw(c-450,0) -416.89,17.61 ; -383.11,-17.61 cw(c-350,0) -383.11,17.61 ; -367.61,-33.11 ccw(c-350,0) -332.39,-33.11 ; -367.61,33.11 cw(c-350,0) -332.39,33.11 ; -316.89,-17.61 ccw(c-350,0) -316.89,17.61 ; -283.11,-17.61 cw(c-250,0) -283.11,17.61 ; -267.61,-33.11 ccw(c-250,0) -232.39,-33.11 ; -267.61,33.11 cw(c-250,0) -232.39,33.11 ; -216.89,-17.61 ccw(c-250,0) -216.89,17.61 ; -183.11,-17.61 cw(c-150,0) -183.11,17.61 ; -167.61,-33.11 ccw(c-150,0) -132.39,-33.11 ; -167.61,33.11 cw(c-150,0) -132.39,33.11 ; -116.89,-17.61 ccw(c-150,0) -116.89,17.61 ; -83.11,-17.61 cw(c-50,0) -83.11,17.61 ; -67.61,-33.11 ccw(c-50,0) -32.39,-33.11 ; -67.61,33.11 cw(c-50,0) -32.39,33.11 ; -16.89,-17.61 ccw(c-50,0) -16.89,17.61 ; 16.89,-17.61 cw(c50,0) 16.89,17.61 ; 32.39,-33.11 ccw(c50,0) 67.61,-33.11 ; 32.39,33.11 cw(c50,0) 67.61,33.11 ; 83.11,-17.61 ccw(c50,0) 83.11,17.61 ; 116.89,-17.61 cw(c150,0) 116.89,17.61 ; 132.39,-33.11 ccw(c150,0) 167.61,-33.11 ; 132.39,33.11 cw(c150,0) 167.61,33.11 ; 183.11,-17.61 ccw(c150,0) 183.11,17.61 ; 216.89,-17.61 cw(c250,0) 216.89,17.61 ; 232.39,-33.11 ccw(c250,0) 267.61,-33.11 ; 232.39,33.11 cw(c250,0) 267.61,33.11 ; 283.11,-17.61 ccw(c250,0) 283.11,17.61 ; 316.89,-17.61 cw(c350,0) 316.89,17.61 ; 332.39,-33.11 ccw(c350,0) 367.61,-33.11 ; 332.39,33.11 cw(c350,0) 367.61,33.11 ; 383.11,-17.61 ccw(c350,0) 383.11,17.61 ; 416.89,-17.61 cw(c450,0) 416.89,17.61 ; 432.39,-33.11 ccw(c450,0) 467.61,-33.11 ; 432.39,33.11 cw(c450,0) 467.61,33.11 ; 483.11,-17.61 ccw(c450,0) 483.11,17.61
9 Top Assy:
  lines w2: -500,-49 500,-49 500,49 -500,49 -500,-49
  text ".Designator" at -104.97,-27.99 h60
3D body: height 100, standoff 0, extent -500,-49 500,49
3D body: height 330, standoff 100, extent -462.5,-12.5 -437.5,12.5
3D body: height 330, standoff 100, extent -362.5,-12.5 -337.5,12.5
3D body: height 330, standoff 100, extent -262.5,-12.5 -237.5,12.5
3D body: height 330, standoff 100, extent -162.5,-12.5 -137.5,12.5
3D body: height 330, standoff 100, extent -62.5,-12.5 -37.5,12.5
3D body: height 330, standoff 100, extent 37.5,-12.5 62.5,12.5
3D body: height 330, standoff 100, extent 137.5,-12.5 162.5,12.5
3D body: height 330, standoff 100, extent 237.5,-12.5 262.5,12.5
3D body: height 330, standoff 100, extent 337.5,-12.5 362.5,12.5
3D body: height 330, standoff 100, extent 437.5,-12.5 462.5,12.5
3D body: height 0, standoff -122, extent -473.5,-6 -426.49,6.01
3D body: height 0, standoff -122, extent -373.5,-6 -326.49,6
3D body: height 0, standoff -122, extent -273.5,-6 -226.49,6
3D body: height 0, standoff -122, extent -173.5,-6 -126.49,6
3D body: height 0, standoff -122, extent -73.5,-6 -26.49,6
3D body: height 0, standoff -122, extent 26.5,-6 73.51,6
3D body: height 0, standoff -122, extent 126.5,-6 173.51,6
3D body: height 0, standoff -122, extent 226.5,-6 273.51,6
3D body: height 0, standoff -122, extent 326.5,-6 373.51,6
3D body: height 0, standoff -122, extent 426.5,-6 473.51,6

## CONN-JHLP-10006 [mil] "CONN-JHLP-10110"
height 420
pads (6):
  rect 70x70 hole 40: 1(0,0)
  round 70 hole 40: 2(-100,0) 3(-200,0) 4(-300,0) 5(-400,0) 6(-500,0)
Top Overlay:
  lines w5: -550,55 50,55 ; -550,-125 -550,125 50,125 50,-125 -550,-125
  text "1" at -5,140 h50
  text "6" at -520,140 h50
9 Top Assy:
  lines w5: -550,-125 50,-125 50,125 -550,125 -550,-125
  text ".Designator" at -389.95,-40 h80
3D body: height 420.6, standoff -139.4, extent -546.99,-128 47.01,122

## CONN-JHLP-10110 [mil] "CONN-JHLP-10110"
height 420
pads (10):
  rect 70x70 hole 45: 1(0,0)
  round 70 hole 45: 2(100,0) 3(200,0) 4(300,0) 5(400,0) 6(500,0) 7(600,0) 8(700,0) 9(800,0) 10(900,0)
Top Overlay:
  lines w5: -50,50 950,50 ; -50,-140 950,-140 950,130 -50,130 -50,-140
  text "10" at 880,150 h50
  text "1" at -20,150 h50
9 Top Assy:
  lines w5: -50,-140 -50,130 950,130 950,-140 -50,-140
  text ".Designator" at 87.98,-98.32 h80
3D body: height 395, standoff -140, extent -49.99,-104.99 950.01,125.01

## CONN-JIS1-06022 [mil] "END CONN;1X5 PIN;.1 CTR;22GA;LOCKING;POL"
13 Top 3D Bodies:
  lines w2: -300,-143 -300,136 300,136 300,-143 -300,-143
3D body: height 645, standoff 125, extent -300,-143 300,136

## CONN-JMF0-03400 [mm]
height 20.904
pads (38):
  round 1.778 hole 1.015 mask+0.102: 1(0,0) 2(0,2.7) 3(0,10.5) 4(0,13.2) 5(2.7,0) 6(2.7,2.7) 7(2.7,10.5) 8(2.7,13.2) 9(5.4,0) 10(5.4,2.7) 11(5.4,10.5) 12(5.4,13.2) 13(8.1,0) 14(8.1,2.7) 15(8.1,10.5) 16(8.1,13.2) 17(12.9,0) 18(12.9,4.4) 19(12.9,8.8) 20(12.9,13.2) 21(17.2,0) 22(17.2,4.4) 23(17.2,8.8) 24(17.2,13.2) 27(26.6,6.6) 32(38.6,6.6)
  round 2.413 hole 1.615 mask+0.102: 25(23.6,2.1) 26(23.6,11.1) 28(28.6,2.1) 29(28.6,11.1) 30(36.6,2.1) 31(36.6,11.1) 33(41.1,2.1) 34(41.1,11.1)
  round 1 hole 1.7 unplated mask+0.838: ""(2.1,19.07) ""(40,19.07)
  round 1.5 hole 2.67 unplated mask+1.1: ""(4.05,6.6) ""(32.6,19.07)
Top Overlay:
  lines w0.127: -3.15,-4.9 45.25,-4.9 45.25,31.367 -3.15,31.367 -3.15,-4.9
9 Top Assy:
  lines w0.051: -2.998,31.367 45.1,31.367 ; -2.998,-3.41 -2.998,38.061 45.1,38.061 45.1,-3.41 -2.998,-3.41
  text ".Designator" at 20.114,-1.982 h1.52
13 Top 3D Bodies:
  text "BOARD EDGE" at 5.887,31.798 h1.52
Mechanical 31:
  circle w0.127: c23.602,2.097 r0.8
  circle w0.127: c28.602,2.097 r0.8
  circle w0.127: c36.602,2.097 r0.8
  circle w0.127: c41.102,2.097 r0.8
  circle w0.127: c12.902,4.397 r0.5
  circle w0.127: c12.902,-0.003 r0.5
  circle w0.127: c17.202,4.397 r0.5
  circle w0.127: c17.202,-0.003 r0.5
  circle w0.127: c0.002,2.697 r0.5
  circle w0.127: c0.002,-0.003 r0.5
  circle w0.127: c2.702,2.697 r0.5
  circle w0.127: c5.402,2.697 r0.5
  circle w0.127: c8.102,2.697 r0.5
  circle w0.127: c2.702,-0.003 r0.5
  circle w0.127: c5.402,-0.003 r0.5
  circle w0.127: c8.102,-0.003 r0.5
  circle w0.127: c32.602,19.067 r1.335
  circle w0.127: c40.002,19.067 r0.85
  circle w0.127: c23.602,11.097 r0.8
  circle w0.127: c28.602,11.097 r0.8
  circle w0.127: c36.602,11.097 r0.8
  circle w0.127: c41.102,11.097 r0.8
  circle w0.127: c26.602,6.597 r0.5
  circle w0.127: c12.902,8.797 r0.5
  circle w0.127: c12.902,13.197 r0.5
  circle w0.127: c17.202,13.197 r0.5
  circle w0.127: c17.202,8.797 r0.5
  circle w0.127: c38.602,6.597 r0.5
  circle w0.127: c4.052,6.597 r1.335
  circle w0.127: c0.002,10.497 r0.5
  circle w0.127: c0.002,13.197 r0.5
  circle w0.127: c2.702,10.497 r0.5
  circle w0.127: c2.702,13.197 r0.5
  circle w0.127: c5.402,13.197 r0.5
  circle w0.127: c5.402,10.497 r0.5
  circle w0.127: c8.102,10.497 r0.5
  circle w0.127: c8.102,13.197 r0.5
  circle w0.127: c2.102,19.067 r0.85
  lines w0.127: -2.998,31.367 -2.998,-4.583 45.102,-4.583 45.102,31.367
3D body: height 20.9, standoff 0, extent -3.2,-5 45.2,31.35

## CONN-JMF0-03400-old [mm]
height 20.904
pads (38):
  round 1.524 hole 1 mask+0.102: 1(0,0) 2(0,2.7) 3(0,10.5) 4(0,13.2) 5(2.7,0) 6(2.7,2.7) 8(2.7,13.2) 9(5.4,0) 10(5.4,2.7) 11(5.4,10.5) 12(5.518,13.1) 13(8.1,0) 15(8.1,10.5) 16(8.1,13.1) 18(12.9,4.4) 19(12.9,8.8) 20(12.9,13.2) 21(17.2,0) 22(17.4,4.4) 23(17.2,8.8) 24(17.2,13.2) 32(38.6,6.6)
  round 1.524 hole 0.991 mask+0.102: 7(2.724,10.5) 14(8.1,2.7) 17(12.9,0) 27(26.6,6.6)
  round 2.54 hole 1.6 mask+0.102: 25(23.6,2.1) 26(23.6,11.1) 29(28.6,11.1)
  round 2.083 hole 1.6 mask+0.102: 28(28.6,2.1) 30(36.6,2.1) 31(36.6,11.1) 33(41.1,2.1) 34(41.1,11.1)
  round 1 hole 1.7 unplated mask+0.838: ""(2.1,19.07) ""(40,19.07)
  round 1.5 hole 2.67 unplated mask+1.1: ""(4.1,6.6) ""(32.6,19.07)
Top Overlay:
  lines w0.127: -2.026,31.416 44.1,31.416 44.1,-9.9 -2,-9.9 ; -2.001,-9.9 -2.001,31.416
13 Top 3D Bodies:
  lines w0.254: -2,-9.9 44.1,-9.9 44.1,37.72 -2,37.72 -2,37.72 -2,-9.9
  text "BOARD EDGE" at -18.053,30.654 h1.52
15 Top Optical Placement:
  lines w0.127: -2.026,31.416 44.1,31.416 ; -2,21.42 44.1,21.42 ; -2,-9.9 44.1,-9.9 44.1,37.72 -2,37.72 -2,-9.9
  text ".Designator" at 11.462,-5.897 h1.52
3D body: height 20.9, standoff 0, extent -1.975,-9.962 44.2,37.75

## CONN-JMF0-12000 [mm] "CONN; 8-SIG/4-GNDX10 COL;RT ANG; PRESS-FIT; Z-PACK"
height 21.43
pads (120):
  round 1.194 hole 0.6 unplated: A1(22.5,0) A2(20,0) A3(17.5,0) A4(15,0) A5(12.5,0) A6(10,0) A7(7.5,0) A8(5,0) A9(2.5,0) A10(0,0) B1(22.5,1.5) B2(20,1.5) B3(17.5,1.5) B4(15,1.5) B5(12.5,1.5) B6(10,1.5) B7(7.5,1.5) B8(5,1.5) B9(2.5,1.5) B10(0,1.5) BG1(22.5,3) BG2(20,3) BG3(17.5,3) BG4(15,3) BG5(12.5,3) BG6(10,3) BG7(7.5,3) BG8(5,3) BG9(2.5,3) BG10(0,3) C1(22.5,4.5) C2(20,4.5) C3(17.5,4.5) C4(15,4.5) C5(12.5,4.5) C6(10,4.5) C7(7.5,4.5) C8(5,4.5) C9(2.5,4.5) C10(0,4.5) D1(22.5,6) D2(20,6) D3(17.5,6) D4(15,6) D5(12.5,6) D6(10,6) D7(7.5,6) D8(5,6) D9(2.5,6) D10(0,6) DG1(22.5,7.5) DG2(20,7.5) DG3(17.5,7.5) DG4(15,7.5) DG5(12.5,7.5) DG6(10,7.5) DG7(7.5,7.5) DG8(5,7.5) DG9(2.5,7.5) DG10(0,7.5) E1(22.5,9) E2(20,9) E3(17.5,9) E4(15,9) E5(12.5,9) E6(10,9) E7(7.5,9) E8(5,9) E9(2.5,9) E10(0,9) F1(22.5,10.5) F2(20,10.5) F3(17.5,10.5) F4(15,10.5) F5(12.5,10.5) F6(10,10.5) F7(7.5,10.5) F8(5,10.5) F9(2.5,10.5) F10(0,10.5) FG1(22.5,12) FG2(20,12) FG3(17.5,12) FG4(15,12) FG5(12.5,12) FG6(10,12) FG7(7.5,12) FG8(5,12) FG9(2.5,12) FG10(0,12) G1(22.5,13.5) G2(20,13.5) G3(17.5,13.5) G4(15,13.5) G5(12.5,13.5) G6(10,13.5) G7(7.5,13.5) G8(5,13.5) G9(2.5,13.5) G10(0,13.5) H1(22.5,15) H2(20,15) H3(17.5,15) H4(15,15) H5(12.5,15) H6(10,15) H7(7.5,15) H8(5,15) H9(2.5,15) H10(0,15) HG1(22.5,16.5) HG2(20,16.5) HG3(17.5,16.5) HG4(15,16.5) HG5(12.5,16.5) HG6(10,16.5) HG7(7.5,16.5) HG8(5,16.5) HG9(2.5,16.5) HG10(0,16.5)
Top Overlay:
  lines w0.127: -1.37,17.46 -1.37,-2 23.62,-2 23.62,17.5 -1.37,17.5
  text "HG10" at -1.25,18 h1.02
  text "HG1" at 21.25,17.75 h1.02
  text "A1" at 21.925,-1.8 h1.02
  text "A10" at -0.15,-1.875 h1.02
15 Top Optical Placement:
  lines w0.051: -1.25,-2 23.5,-2 ; -1.375,-10.86 -1.375,17.5 23.625,17.5 23.625,-10.86 -1.375,-10.86
  text ".Designator" at 1.055,7.972 h2.03
  text "A1" at 21.75,-3.25 h1.02
  text "A10" at -0.75,-3.5 h1.02
  text "HG1" at 21.25,17.75 h1.02
  text "HG10" at -1.25,18 h1.02
3D body: height 21.43, standoff 0, extent -1.325,-10.85 23.575,17.45

## CONN-JRMF-00100 [mil] "Straight PCB jack receptacle"
height 236.22
pads (5):
  round 60 hole 31 paste+0 mask+70: 1(0,0)
  round 53 / inner round 53 / far side oval 53x68 hole 31: 2(-50,-50) 2(-50,50) 2(50,-50) 2(50,50)
Top Overlay:
  circle w5: c0,0 r110
9 Top Assy:
  circle w5: c0,0 r94
  circle w5: c0,0 r30
  text ".Designator" at -85,110 h20
3D body: height 20, standoff 0, extent 30.16,-69.96 70.01,-30.03
3D body: height 20, standoff 0, extent -69.84,-69.96 -29.99,-30.03
3D body: height 20, standoff 0, extent 30.16,30.04 70.01,69.97
3D body: height 20, standoff 0, extent -69.84,30.04 -29.99,69.97
3D body: height 221, standoff 20, extent -94,-94 94,94